# Altium footprint library 显示器件.PcbLib: 36 footprints (part 3 of 3)
Each footprint in its own frame and in the unit in brackets; x right, y up, seen from the top. Pads: shape width x height; smd on the part's side, far side on the other; paste and mask are expansions set on the pad; w line width, h text height; cw(c..) or ccw(c..) is an arc to the next point about the centre after c.
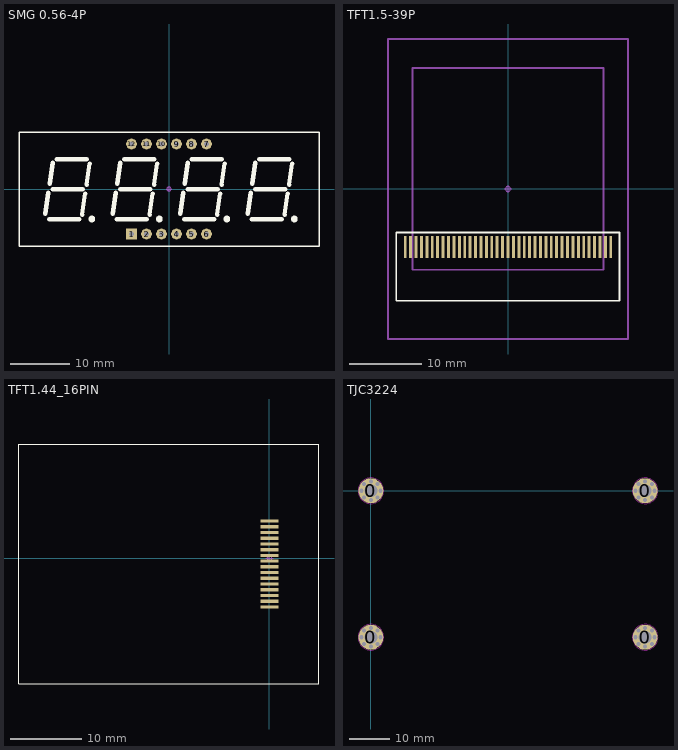
[diagram p2: the footprints below, top view; thin cyan lines are the x and y axes]

## SMG 0.56-4P [mm] "4位0.56寸数码管，50.3*19mm"
pads (12):
  rect 1.8x1.8 hole 0.9: 1(-6.35,-7.62)
  round 1.8 hole 0.9: 2(-3.81,-7.62) 3(-1.27,-7.62) 4(1.27,-7.62) 5(3.81,-7.62) 6(6.35,-7.62) 7(6.35,7.62) 8(3.81,7.62) 9(1.27,7.62) 10(-1.27,7.62) 11(-3.81,7.62) 12(-6.35,7.62)
Top Overlay:
  circle w0.635: c-13.081,-5.08 r0.254
  circle w0.635: c-1.651,-5.08 r0.254
  circle w0.635: c9.779,-5.08 r0.254
  circle w0.635: c21.209,-5.08 r0.254
  lines w0.254: -25.4,-9.652 25.4,-9.652 25.4,9.652 -25.4,9.652 -25.4,-9.652
  lines w0.762: -20.955,-4.191 -20.447,-0.635 ; -20.32,-5.08 -15.24,-5.08 ; -20.193,0.889 -19.685,4.445 ; -19.685,0 -14.605,0 ; -19.05,5.08 -13.97,5.08 ; -14.732,-4.318 -14.224,-0.762 ; -13.97,0.762 -13.462,4.318 ; -9.525,-4.191 -9.017,-0.635 ; -8.89,-5.08 -3.81,-5.08 ; -8.763,0.889 -8.255,4.445 ; -8.255,0 -3.175,0 ; -7.62,5.08 -2.54,5.08 ; -3.302,-4.318 -2.794,-0.762 ; -2.54,0.762 -2.032,4.318 ; 1.905,-4.191 2.413,-0.635 ; 2.54,-5.08 7.62,-5.08 ; 2.667,0.889 3.175,4.445 ; 3.175,0 8.255,0 ; 3.81,5.08 8.89,5.08 ; 8.128,-4.318 8.636,-0.762 ; 8.89,0.762 9.398,4.318 ; 13.335,-4.191 13.843,-0.635 ; 13.97,-5.08 19.05,-5.08 ; 14.097,0.889 14.605,4.445 ; 14.605,0 19.685,0 ; 15.24,5.08 20.32,5.08 ; 19.558,-4.318 20.066,-0.762 ; 20.32,0.762 20.828,4.318
Mechanical 15:
  circle w0.05: c0,0 r0.35
  lines w0.05: -0.5,0 0.5,0 ; 0,-0.5 0,0.5
3D body: height 8, standoff -3.6, extent -25.15,-9.5 25.15,9.5

## TFT1.5-39P [mm] "长41.6mm，宽33.4mm，厚2.7mm，脚距0.75mm"
pads (39):
  rect 0.4x3 smd: 1(-14.25,-8.05) 2(-13.5,-8.05) 3(-12.75,-8.05) 4(-12,-8.05) 5(-11.25,-8.05) 6(-10.5,-8.05) 7(-9.75,-8.05) 8(-9,-8.05) 9(-8.25,-8.05) 10(-7.5,-8.05) 11(-6.75,-8.05) 12(-6,-8.05) 13(-5.25,-8.05) 14(-4.5,-8.05) 15(-3.75,-8.05) 16(-3,-8.05) 17(-2.25,-8.05) 18(-1.5,-8.05) 19(-0.75,-8.05) 20(0,-8.05) 21(0.75,-8.05) 22(1.5,-8.05) 23(2.25,-8.05) 24(3,-8.05) 25(3.75,-8.05) 26(4.5,-8.05) 27(5.25,-8.05) 28(6,-8.05) 29(6.75,-8.05) 30(7.5,-8.05) 31(8.25,-8.05) 32(9,-8.05) 33(9.75,-8.05) 34(10.5,-8.05) 35(11.25,-8.05) 36(12,-8.05) 37(12.75,-8.05) 38(13.5,-8.05) 39(14.25,-8.05)
Top Overlay:
  lines w0.254: -15.495,-15.5 15.468,-15.5 15.468,-6.05 -15.495,-6.05 -15.495,-15.5
Mechanical 15:
  circle w0.05: c0,0 r0.35
  lines w0.05: -0.5,0 0.5,0 ; 0,-0.5 0,0.5
  lines w0.254: -16.65,-20.8 16.65,-20.8 16.65,20.8 -16.65,20.8 -16.65,-20.8 ; -13.25,-11.2 -13.25,7.7 -13.25,16.8 13.25,16.8 13.25,-11.2 -13.25,-11.2
3D body: height 6.65, standoff 0, extent -16.65,-20.884 16.65,20.85

## TFT1.44_16PIN [mm]
pads (16):
  rect 2.5x0.45 smd: 1(0,5.2) 2(0,4.4) 3(0,3.6) 4(0,2.8) 5(0,2) 6(0,1.2) 7(0,0.4) 8(0,-0.4) 9(0,-1.2) 10(0,-2) 11(0,-2.8) 12(0,-3.6) 13(0,-4.4) 14(0,-5.2) 15(0,-6) 16(0,-6.8)
Top Overlay:
  lines w0.127: -35.015,-17.57 6.925,-17.57 6.925,15.958 -35.015,15.958 -35.015,-17.57
Mechanical 15:
  circle w0.05: c0,0 r0.35
  lines w0.05: -0.5,0 0.5,0 ; 0,-0.5 0,0.5
3D body: height 2.75, standoff -0.01, extent -35.044,-17.481 6.896,15.869

## TJC3224 [mm]
pads (36):
  round 1 hole 1: 0(-2.35,-36.49) 0(-2.35,0) 0(-1.662,-38.152) 0(-1.662,-34.828) 0(-1.662,-1.662) 0(-1.662,1.662) 0(0,-38.84) 0(0,-34.14) 0(0,-2.35) 0(0,2.35) 0(1.662,-38.152) 0(1.662,-34.828) 0(1.662,-1.662) 0(1.662,1.662) 0(2.35,-36.49) 0(2.35,0) 0(65.97,-36.49) 0(65.97,0) 0(66.658,-38.152) 0(66.658,-34.828) 0(66.658,-1.662) 0(66.658,1.662) 0(68.32,-38.84) 0(68.32,-34.14) 0(68.32,-2.35) 0(68.32,2.35) 0(69.982,-38.152) 0(69.982,-34.828) 0(69.982,-1.662) 0(69.982,1.662) 0(70.67,-36.49) 0(70.67,0)
  round 6.2 hole 3.2: 0(0,-36.49) 0(0,0) 0(68.32,-36.49) 0(68.32,0)
Keep-Out Layer:
  circle w0.254: c0,-36.49 r3.2
  circle w0.254: c68.32,-36.49 r3.2
  circle w0.254: c68.32,0 r3.2
  circle w0.254: c0,0 r3.2
Mechanical 15:
  circle w0.05: c0,0 r0.35
  lines w0.05: -0.5,0 0.5,0 ; 0,-0.5 0,0.5
3D body: height 15.8, standoff 0, extent -3.023,-39.573 71.377,3.147